# Altium footprint library Package_DFN_QFN.PcbLib: 557 footprints (part 7 of 35)
Each footprint in its own frame and in the unit in brackets; x right, y up, seen from the top. Pads: shape width x height; smd on the part's side, far side on the other; paste and mask are expansions set on the pad; w line width, h text height; cw(c..) or ccw(c..) is an arc to the next point about the centre after c.
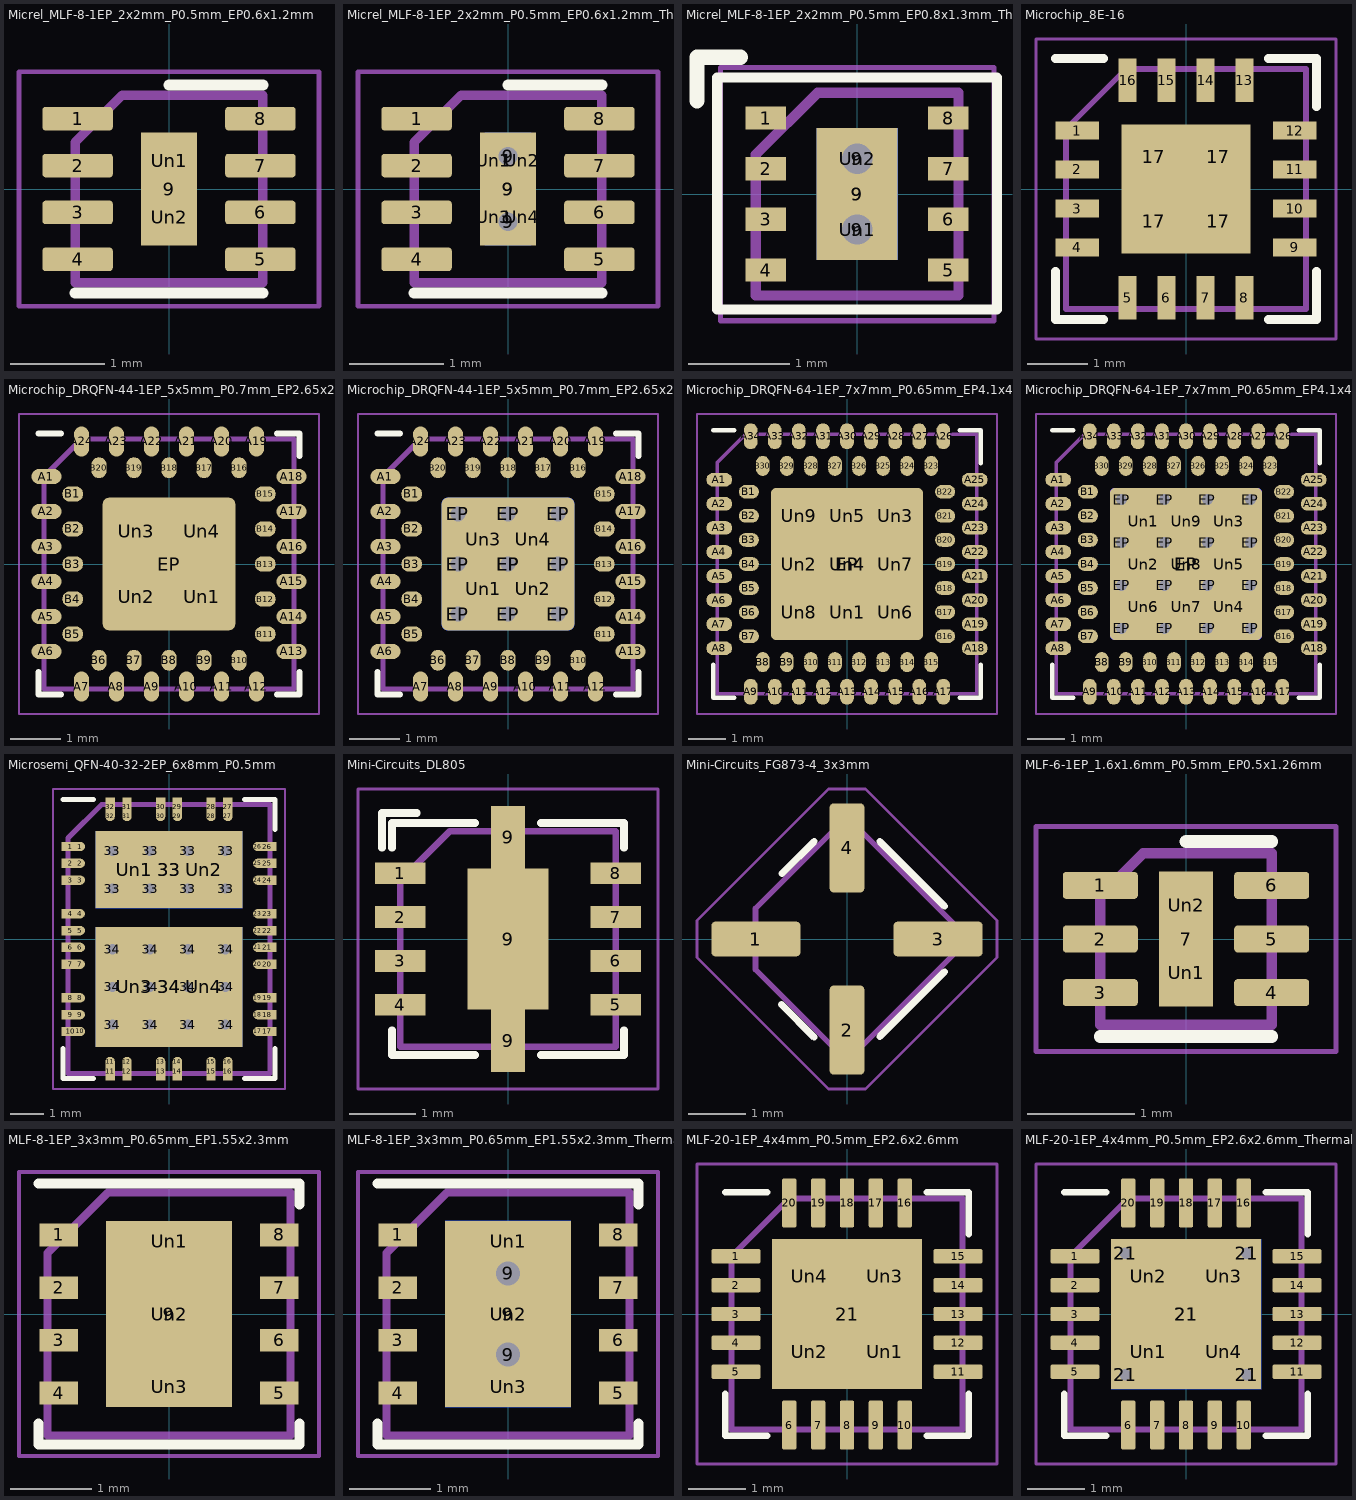
[diagram p6: the footprints below, top view; thin cyan lines are the x and y axes]

## Micrel_MLF-8-1EP_2x2mm_P0.5mm_EP0.6x1.2mm [mm]
pads (11):
  rrect25% 0.75x0.25 smd: 1(-0.975,0.75) 2(-0.975,0.25) 3(-0.975,-0.25) 4(-0.975,-0.75) 5(0.975,-0.75) 6(0.975,-0.25) 7(0.975,0.25) 8(0.975,0.75)
  rect 0.6x1.2 smd: 9(0,0)
  rrect25% 0.48x0.48 on Top Paste: Un1(0,0.3) Un2(0,-0.3)
F.SilkS:
  lines w0.12: -1,-1.11 1,-1.11 ; 0,1.11 1,1.11
F.CrtYd:
  lines w0.05: -1.6,-1.25 1.6,-1.25 1.6,1.25 -1.6,1.25 -1.6,-1.25
F.Fab:
  lines w0.1: -1,-1 -1,0.5 -0.5,1 1,1 1,-1 -1,-1
  text "'.Designator'" at -2.028,-0.425 h0.5

## Micrel_MLF-8-1EP_2x2mm_P0.5mm_EP0.6x1.2mm_ThermalVias [mm]
pads (16):
  rrect25% 0.75x0.25 smd: 1(-0.975,0.75) 2(-0.975,0.25) 3(-0.975,-0.25) 4(-0.975,-0.75) 5(0.975,-0.75) 6(0.975,-0.25) 7(0.975,0.25) 8(0.975,0.75)
  round 0.5 hole 0.2: 9(0,-0.35) 9(0,0.35)
  rect 0.5x1.2 smd far side: 9(0,0)
  rect 0.6x1.2 smd: 9(0,0)
  rrect25% 0.24x0.48 on Top Paste: Un1(-0.15,0.3) Un2(0.15,0.3) Un3(-0.15,-0.3) Un4(0.15,-0.3)
F.SilkS:
  lines w0.12: -1,-1.11 1,-1.11 ; 0,1.11 1,1.11
F.CrtYd:
  lines w0.05: -1.6,-1.25 -1.6,1.25 1.6,1.25 1.6,-1.25 -1.6,-1.25
F.Fab:
  lines w0.1: -1,-1 1,-1 1,1 -0.5,1 -1,0.5 -1,-1
  text "'.Designator'" at -2.028,-0.425 h0.5

## Micrel_MLF-8-1EP_2x2mm_P0.5mm_EP0.8x1.3mm_ThermalVias [mm]
pads (14):
  rect 0.4x0.23 smd: 1(-0.9,0.75) 2(-0.9,0.25) 3(-0.9,-0.25) 4(-0.9,-0.75) 5(0.9,-0.75) 6(0.9,-0.25) 7(0.9,0.25) 8(0.9,0.75)
  round 0.6 hole 0.3: 9(0,-0.35) 9(0,0.35)
  rect 0.8x1.3 smd far side: 9(0,0)
  rect 0.8x1.3 smd: 9(0,0)
  rect 0.55x0.55 on Top Paste: Un1(0,-0.35) Un2(0,0.35)
F.SilkS:
  lines w0.1: -1.38,-1.14 -1.38,1.15 1.38,1.15 1.38,-1.14 -1.38,-1.14
  lines w0.15: -1.58,0.92 -1.58,1.35 -1.15,1.35
F.CrtYd:
  lines w0.05: -1.35,-1.25 1.35,-1.25 1.35,1.25 -1.35,1.25 -1.35,-1.25
F.Fab:
  lines w0.1: -1,0.38 -1,-1 1,-1 1,1 -0.39,1 -1,0.39
  text "'.Designator'" at -2.023,-0.42 h0.5

## Microchip_8E-16 [mm]
pads (20):
  rect 0.725x0.3 smd: 1(-1.813,0.975) 2(-1.813,0.325) 3(-1.813,-0.325) 4(-1.813,-0.975) 9(1.813,-0.975) 10(1.813,-0.325) 11(1.813,0.325) 12(1.813,0.975)
  rect 0.3x0.725 smd: 5(-0.975,-1.813) 6(-0.325,-1.813) 7(0.325,-1.813) 8(0.975,-1.813) 13(0.975,1.813) 14(0.325,1.813) 15(-0.325,1.813) 16(-0.975,1.813)
  rect 1.075x1.075 smd: 17(-0.537,-0.537) 17(-0.537,0.537) 17(0.537,-0.537) 17(0.537,0.537)
F.SilkS:
  lines w0.15: -2.175,-1.375 -2.175,-2.175 -1.375,-2.175 ; -2.175,2.175 -1.375,2.175 ; 1.375,-2.175 2.175,-2.175 2.175,-1.375 ; 1.375,2.175 2.175,2.175 2.175,1.375
F.CrtYd:
  lines w0.05: -2.5,-2.5 -2.5,2.5 2.5,2.5 2.5,-2.5 -2.5,-2.5
F.Fab:
  lines w0.1: -2,-2 2,-2 2,2 -1,2 -2,1 -2,-2
  text "'.Designator'" at -3.267,-0.702 h0.8

## Microchip_DRQFN-44-1EP_5x5mm_P0.7mm_EP2.65x2.65mm [mm]
pads (49):
  rrect100% 0.6x0.3 smd: A1(-2.45,1.75) A2(-2.45,1.05) A3(-2.45,0.35) A4(-2.45,-0.35) A5(-2.45,-1.05) A6(-2.45,-1.75) A13(2.45,-1.75) A14(2.45,-1.05) A15(2.45,-0.35) A16(2.45,0.35) A17(2.45,1.05) A18(2.45,1.75)
  rrect100% 0.3x0.6 smd: A7(-1.75,-2.45) A8(-1.05,-2.45) A9(-0.35,-2.45) A10(0.35,-2.45) A11(1.05,-2.45) A12(1.75,-2.45) A19(1.75,2.45) A20(1.05,2.45) A21(0.35,2.45) A22(-0.35,2.45) A23(-1.05,2.45) A24(-1.75,2.45)
  rrect100% 0.42x0.3 smd: B1(-1.925,1.4) B2(-1.925,0.7) B3(-1.925,0) B4(-1.925,-0.7) B5(-1.925,-1.4) B11(1.925,-1.4) B12(1.925,-0.7) B13(1.925,0) B14(1.925,0.7) B15(1.925,1.4)
  rrect100% 0.3x0.42 smd: B6(-1.4,-1.925) B7(-0.7,-1.925) B8(0,-1.925) B9(0.7,-1.925) B10(1.4,-1.925) B16(1.4,1.925) B17(0.7,1.925) B18(0,1.925) B19(-0.7,1.925) B20(-1.4,1.925)
  rrect9% 2.65x2.65 smd: EP(0,0)
  rrect10% 1.1x1.1 on Top Paste: Un1(0.65,-0.65) Un2(-0.65,-0.65) Un3(-0.65,0.65) Un4(0.65,0.65)
F.SilkS:
  lines w0.12: -2.61,-2.16 -2.61,-2.61 -2.16,-2.61 ; -2.61,2.61 -2.16,2.61 ; 2.16,-2.61 2.61,-2.61 2.61,-2.16 ; 2.16,2.61 2.61,2.61 2.61,2.16
F.CrtYd:
  lines w0.05: -3,-3 -3,3 3,3 3,-3 -3,-3
F.Fab:
  lines w0.1: -2.5,-2.5 -2.5,1.75 -1.75,2.5 2.5,2.5 2.5,-2.5 -2.5,-2.5
  text "'.Designator'" at -4.047,-0.84 h1

## Microchip_DRQFN-44-1EP_5x5mm_P0.7mm_EP2.65x2.65mm_ThermalVias [mm]
pads (59):
  rrect100% 0.6x0.3 smd: A1(-2.45,1.75) A2(-2.45,1.05) A3(-2.45,0.35) A4(-2.45,-0.35) A5(-2.45,-1.05) A6(-2.45,-1.75) A13(2.45,-1.75) A14(2.45,-1.05) A15(2.45,-0.35) A16(2.45,0.35) A17(2.45,1.05) A18(2.45,1.75)
  rrect100% 0.3x0.6 smd: A7(-1.75,-2.45) A8(-1.05,-2.45) A9(-0.35,-2.45) A10(0.35,-2.45) A11(1.05,-2.45) A12(1.75,-2.45) A19(1.75,2.45) A20(1.05,2.45) A21(0.35,2.45) A22(-0.35,2.45) A23(-1.05,2.45) A24(-1.75,2.45)
  rrect100% 0.42x0.3 smd: B1(-1.925,1.4) B2(-1.925,0.7) B3(-1.925,0) B4(-1.925,-0.7) B5(-1.925,-1.4) B11(1.925,-1.4) B12(1.925,-0.7) B13(1.925,0) B14(1.925,0.7) B15(1.925,1.4)
  rrect100% 0.3x0.42 smd: B6(-1.4,-1.925) B7(-0.7,-1.925) B8(0,-1.925) B9(0.7,-1.925) B10(1.4,-1.925) B16(1.4,1.925) B17(0.7,1.925) B18(0,1.925) B19(-0.7,1.925) B20(-1.4,1.925)
  round 0.6 hole 0.3: EP(-1,-1) EP(-1,0) EP(-1,1) EP(0,-1) EP(0,0) EP(0,1) EP(1,-1) EP(1,0) EP(1,1)
  rrect9% 2.65x2.65 smd far side: EP(0,0)
  rrect9% 2.65x2.65 smd: EP(0,0)
  rrect25% 0.85x0.85 on Top Paste: Un1(-0.5,-0.5) Un2(0.5,-0.5) Un3(-0.5,0.5) Un4(0.5,0.5)
F.SilkS:
  lines w0.12: -2.61,-2.16 -2.61,-2.61 -2.16,-2.61 ; -2.61,2.61 -2.16,2.61 ; 2.16,-2.61 2.61,-2.61 2.61,-2.16 ; 2.16,2.61 2.61,2.61 2.61,2.16
F.CrtYd:
  lines w0.05: -3,-3 -3,3 3,3 3,-3 -3,-3
F.Fab:
  lines w0.1: -2.5,-2.5 2.5,-2.5 2.5,2.5 -1.75,2.5 -2.5,1.75 -2.5,-2.5
  text "'.Designator'" at -4.047,-0.84 h1

## Microchip_DRQFN-64-1EP_7x7mm_P0.65mm_EP4.1x4.1mm [mm]
pads (74):
  rrect100% 0.7x0.37 smd: A1(-3.45,2.275) A2(-3.45,1.625) A3(-3.45,0.975) A4(-3.45,0.325) A5(-3.45,-0.325) A6(-3.45,-0.975) A7(-3.45,-1.625) A8(-3.45,-2.275) A18(3.45,-2.275) A19(3.45,-1.625) A20(3.45,-0.975) A21(3.45,-0.325) A22(3.45,0.325) A23(3.45,0.975) A24(3.45,1.625) A25(3.45,2.275)
  rrect100% 0.37x0.7 smd: A9(-2.6,-3.45) A10(-1.95,-3.45) A11(-1.3,-3.45) A12(-0.65,-3.45) A13(0,-3.45) A14(0.65,-3.45) A15(1.3,-3.45) A16(1.95,-3.45) A17(2.6,-3.45) A26(2.6,3.45) A27(1.95,3.45) A28(1.3,3.45) A29(0.65,3.45) A30(0,3.45) A31(-0.65,3.45) A32(-1.3,3.45) A33(-1.95,3.45) A34(-2.6,3.45)
  rrect100% 0.54x0.37 smd: B1(-2.65,1.95) B2(-2.65,1.3) B3(-2.65,0.65) B4(-2.65,0) B5(-2.65,-0.65) B6(-2.65,-1.3) B7(-2.65,-1.95) B16(2.65,-1.95) B17(2.65,-1.3) B18(2.65,-0.65) B19(2.65,0) B20(2.65,0.65) B21(2.65,1.3) B22(2.65,1.95)
  rrect100% 0.37x0.54 smd: B8(-2.275,-2.65) B9(-1.625,-2.65) B10(-0.975,-2.65) B11(-0.325,-2.65) B12(0.325,-2.65) B13(0.975,-2.65) B14(1.625,-2.65) B15(2.275,-2.65) B23(2.275,2.65) B24(1.625,2.65) B25(0.975,2.65) B26(0.325,2.65) B27(-0.325,2.65) B28(-0.975,2.65) B29(-1.625,2.65) B30(-2.275,2.65)
  rrect6% 4.1x4.1 smd: EP(0,0)
  rrect10% 1.15x1.15 on Top Paste: Un1(0,-1.3) Un2(-1.3,0) Un3(1.3,1.3) Un4(0,0) Un5(0,1.3) Un6(1.3,-1.3) Un7(1.3,0) Un8(-1.3,-1.3) Un9(-1.3,1.3)
F.SilkS:
  lines w0.12: -3.61,-2.72 -3.61,-3.61 -3.045,-3.61 ; -3.61,3.61 -3.045,3.61 ; 3.045,-3.61 3.61,-3.61 3.61,-2.72 ; 3.045,3.61 3.61,3.61 3.61,2.72
F.CrtYd:
  lines w0.05: -4.05,-4.05 4.05,-4.05 4.05,4.05 -4.05,4.05 -4.05,-4.05
F.Fab:
  lines w0.1: -3.5,-3.5 3.5,-3.5 3.5,3.5 -2.75,3.5 -3.5,2.75 -3.5,-3.5
  text "'.Designator'" at -4.047,-0.84 h1

## Microchip_DRQFN-64-1EP_7x7mm_P0.65mm_EP4.1x4.1mm_ThermalVias [mm]
pads (91):
  rrect100% 0.7x0.37 smd: A1(-3.45,2.275) A2(-3.45,1.625) A3(-3.45,0.975) A4(-3.45,0.325) A5(-3.45,-0.325) A6(-3.45,-0.975) A7(-3.45,-1.625) A8(-3.45,-2.275) A18(3.45,-2.275) A19(3.45,-1.625) A20(3.45,-0.975) A21(3.45,-0.325) A22(3.45,0.325) A23(3.45,0.975) A24(3.45,1.625) A25(3.45,2.275)
  rrect100% 0.37x0.7 smd: A9(-2.6,-3.45) A10(-1.95,-3.45) A11(-1.3,-3.45) A12(-0.65,-3.45) A13(0,-3.45) A14(0.65,-3.45) A15(1.3,-3.45) A16(1.95,-3.45) A17(2.6,-3.45) A26(2.6,3.45) A27(1.95,3.45) A28(1.3,3.45) A29(0.65,3.45) A30(0,3.45) A31(-0.65,3.45) A32(-1.3,3.45) A33(-1.95,3.45) A34(-2.6,3.45)
  rrect100% 0.54x0.37 smd: B1(-2.65,1.95) B2(-2.65,1.3) B3(-2.65,0.65) B4(-2.65,0) B5(-2.65,-0.65) B6(-2.65,-1.3) B7(-2.65,-1.95) B16(2.65,-1.95) B17(2.65,-1.3) B18(2.65,-0.65) B19(2.65,0) B20(2.65,0.65) B21(2.65,1.3) B22(2.65,1.95)
  rrect100% 0.37x0.54 smd: B8(-2.275,-2.65) B9(-1.625,-2.65) B10(-0.975,-2.65) B11(-0.325,-2.65) B12(0.325,-2.65) B13(0.975,-2.65) B14(1.625,-2.65) B15(2.275,-2.65) B23(2.275,2.65) B24(1.625,2.65) B25(0.975,2.65) B26(0.325,2.65) B27(-0.325,2.65) B28(-0.975,2.65) B29(-1.625,2.65) B30(-2.275,2.65)
  round 0.6 hole 0.3: EP(-1.74,-1.74) EP(-1.74,-0.58) EP(-1.74,0.58) EP(-1.74,1.74) EP(-0.58,-1.74) EP(-0.58,-0.58) EP(-0.58,0.58) EP(-0.58,1.74) EP(0.58,-1.74) EP(0.58,-0.58) EP(0.58,0.58) EP(0.58,1.74) EP(1.74,-1.74) EP(1.74,-0.58) EP(1.74,0.58) EP(1.74,1.74)
  rrect6% 4.1x4.1 smd: EP(0,0)
  rrect6% 4.1x4.1 smd far side: EP(0,0)
  rrect25% 1x1 on Top Paste: Un1(-1.16,1.16) Un2(-1.16,0) Un3(1.16,1.16) Un4(1.16,-1.16) Un5(1.16,0) Un6(-1.16,-1.16) Un7(0,-1.16) Un8(0,0) Un9(0,1.16)
F.SilkS:
  lines w0.12: -3.61,-2.72 -3.61,-3.61 -3.045,-3.61 ; -3.61,3.61 -3.045,3.61 ; 3.045,-3.61 3.61,-3.61 3.61,-2.72 ; 3.045,3.61 3.61,3.61 3.61,2.72
F.CrtYd:
  lines w0.05: -4.05,-4.05 -4.05,4.05 4.05,4.05 4.05,-4.05 -4.05,-4.05
F.Fab:
  lines w0.1: -3.5,-3.5 3.5,-3.5 3.5,3.5 -2.75,3.5 -3.5,2.75 -3.5,-3.5
  text "'.Designator'" at -4.047,-0.84 h1

## Microsemi_QFN-40-32-2EP_6x8mm_P0.5mm [mm]
pads (92):
  rect 0.56x0.28 smd: 1(-2.92,2.75) 2(-2.92,2.25) 3(-2.92,1.75) 4(-2.92,0.75) 5(-2.92,0.25) 6(-2.92,-0.25) 7(-2.92,-0.75) 8(-2.92,-1.75) 9(-2.92,-2.25) 10(-2.92,-2.75) 17(2.92,-2.75) 18(2.92,-2.25) 19(2.92,-1.75) 20(2.92,-0.75) 21(2.92,-0.25) 22(2.92,0.25) 23(2.92,0.75) 24(2.92,1.75) 25(2.92,2.25) 26(2.92,2.75)
  round 0.28 smd: 1(-2.64,2.75) 2(-2.64,2.25) 3(-2.64,1.75) 4(-2.64,0.75) 5(-2.64,0.25) 6(-2.64,-0.25) 7(-2.64,-0.75) 8(-2.64,-1.75) 9(-2.64,-2.25) 10(-2.64,-2.75) 11(-1.75,-3.645) 12(-1.25,-3.645) 13(-0.25,-3.645) 14(0.25,-3.645) 15(1.25,-3.645) 16(1.75,-3.645) 17(2.64,-2.75) 18(2.64,-2.25) 19(2.64,-1.75) 20(2.64,-0.75) 21(2.64,-0.25) 22(2.64,0.25) 23(2.64,0.75) 24(2.64,1.75) 25(2.64,2.25) 26(2.64,2.75) 27(1.75,3.645) 28(1.25,3.645) 29(0.25,3.645) 30(-0.25,3.645) 31(-1.25,3.645) 32(-1.75,3.645)
  rect 0.28x0.56 smd: 11(-1.75,-3.925) 12(-1.25,-3.925) 13(-0.25,-3.925) 14(0.25,-3.925) 15(1.25,-3.925) 16(1.75,-3.925) 27(1.75,3.925) 28(1.25,3.925) 29(0.25,3.925) 30(-0.25,3.925) 31(-1.25,3.925) 32(-1.75,3.925)
  round 0.6 hole 0.3: 33(-1.68,1.5) 33(-1.68,2.62) 33(-0.56,1.5) 33(-0.56,2.62) 33(0.56,1.5) 33(0.56,2.62) 33(1.68,1.5) 33(1.68,2.62) 34(-1.68,-2.545) 34(-1.68,-1.425) 34(-1.68,-0.305) 34(-0.56,-2.545) 34(-0.56,-1.425) 34(-0.56,-0.305) 34(0.56,-2.545) 34(0.56,-1.425) 34(0.56,-0.305) 34(1.68,-2.545) 34(1.68,-1.425) 34(1.68,-0.305)
  rect 4.37x2.29 smd far side: 33(0,2.06)
  rect 4.37x2.29 smd: 33(0,2.06)
  rect 4.37x3.56 smd: 34(0,-1.425)
  rect 4.37x3.56 smd far side: 34(0,-1.425)
  rect 1.68x1.68 on Top Paste: Un1(-1.04,2.06) Un2(1.04,2.06)
  rect 1.68x2.95 on Top Paste: Un3(-1.04,-1.425) Un4(1.04,-1.425)
F.SilkS:
  lines w0.15: -3.15,-3.25 -3.15,-4.15 -2.25,-4.15 ; -3.15,4.15 -2.25,4.15 ; 2.25,-4.15 3.15,-4.15 3.15,-3.25 ; 2.25,4.15 3.15,4.15 3.15,3.25
F.CrtYd:
  lines w0.05: -3.45,-4.46 3.45,-4.46 3.45,4.46 -3.45,4.46 -3.45,-4.46
F.Fab:
  lines w0.15: -3,-4 -3,3 -2,4 3,4 3,-4 -3,-4
  text "'.Designator'" at -4.047,-0.84 h1

## Mini-Circuits_DL805 [mm]
pads (11):
  rect 0.76x0.33 smd: 1(-1.625,0.99) 2(-1.625,0.33) 3(-1.625,-0.33) 4(-1.625,-0.99) 5(1.625,-0.99) 6(1.625,-0.33) 7(1.625,0.33) 8(1.625,0.99)
  rect 0.51x0.94 smd: 9(0,-1.535) 9(0,1.535)
  rect 1.22x2.13 smd: 9(0,0)
F.SilkS:
  lines w0.12: -1.9,1.375 -1.9,1.9 -1.375,1.9 ; -1.75,-1.375 -1.75,-1.75 -0.5,-1.75 ; -1.75,1.375 -1.75,1.75 -0.5,1.75 ; 0.5,-1.75 1.75,-1.75 1.75,-1.375 ; 0.5,1.75 1.75,1.75 1.75,1.375
F.CrtYd:
  lines w0.05: -2.26,-2.26 -2.26,2.26 2.26,2.26 2.26,-2.26 -2.26,-2.26
F.Fab:
  lines w0.1: -1.625,-1.625 1.625,-1.625 1.625,1.625 -0.875,1.625 -1.625,0.875 -1.625,-1.625
  text "'.Designator'" at -0.42,2.023 h0.5

## Mini-Circuits_FG873-4_3x3mm [mm]
pads (4):
  rrect25% 1.55x0.61 smd: 1(-1.585,0) 3(1.585,0)
  rrect25% 0.61x1.55 smd: 2(0,-1.585) 4(0,1.585)
F.SilkS:
  lines w0.12: -1.14,-1.14 -0.57,-1.71 ; -1.13,1.14 -0.57,1.7 ; 0.57,-1.7 1.7,-0.57 ; 0.57,1.7 1.7,0.57
F.CrtYd:
  lines w0.05: -2.61,-0.32 -2.61,0.32 -0.32,2.61 0.32,2.61 2.61,0.32 2.61,-0.32 0.32,-2.61 -0.32,-2.61 -2.61,-0.32
F.Fab:
  lines w0.1: -1.591,-0.53 -1.591,0.53 0,2.121 2.121,0 0,-2.121 -1.591,-0.53
  text "'.Designator'" at -2.838,-0.593 h0.7

## MLF-6-1EP_1.6x1.6mm_P0.5mm_EP0.5x1.26mm [mm]
pads (9):
  rrect25% 0.7x0.25 smd: 1(-0.8,0.5) 2(-0.8,0) 3(-0.8,-0.5) 4(0.8,-0.5) 5(0.8,0) 6(0.8,0.5)
  rect 0.5x1.26 smd: 7(0,0)
  rrect25% 0.4x0.51 on Top Paste: Un1(0,-0.315) Un2(0,0.315)
F.SilkS:
  lines w0.12: -0.8,-0.91 0.8,-0.91 ; 0,0.91 0.8,0.91
F.CrtYd:
  lines w0.05: -1.4,-1.05 1.4,-1.05 1.4,1.05 -1.4,1.05 -1.4,-1.05
F.Fab:
  lines w0.1: -0.8,-0.8 -0.8,0.4 -0.4,0.8 0.8,0.8 0.8,-0.8 -0.8,-0.8
  text "'.Designator'" at -1.619,-0.336 h0.4

## MLF-8-1EP_3x3mm_P0.65mm_EP1.55x2.3mm [mm]
pads (12):
  rect 0.48x0.28 smd: 1(-1.36,0.975) 2(-1.36,0.325) 3(-1.36,-0.325) 4(-1.36,-0.975) 5(1.36,-0.975) 6(1.36,-0.325) 7(1.36,0.325) 8(1.36,0.975)
  rect 1.55x2.3 smd: 9(0,0)
  rect 1.5x0.4 on Top Paste: Un1(0,0.9) Un3(0,-0.9)
  rect 1.5x0.65 on Top Paste: Un2(0,0)
F.SilkS:
  lines w0.12: -1.61,-1.35 -1.61,-1.61 1.61,-1.61 1.61,-1.35 ; -1.61,1.61 1.61,1.61 1.61,1.35
F.CrtYd:
  lines w0.05: -1.85,-1.75 1.85,-1.75 1.85,1.75 -1.85,1.75 -1.85,-1.75
F.Fab:
  lines w0.1: -1.5,-1.5 -1.5,0.75 -0.75,1.5 1.5,1.5 1.5,-1.5 -1.5,-1.5
  text "'.Designator'" at -2.833,-0.588 h0.7

## MLF-8-1EP_3x3mm_P0.65mm_EP1.55x2.3mm_ThermalVias [mm]
pads (15):
  rect 0.48x0.28 smd: 1(-1.36,0.975) 2(-1.36,0.325) 3(-1.36,-0.325) 4(-1.36,-0.975) 5(1.36,-0.975) 6(1.36,-0.325) 7(1.36,0.325) 8(1.36,0.975)
  round 0.6 hole 0.3: 9(0,-0.5) 9(0,0.5)
  rect 1.55x2.3 smd: 9(0,0)
  rect 1.55x2.3 smd far side: 9(0,0)
  rect 1.5x0.4 on Top Paste: Un1(0,0.9) Un3(0,-0.9)
  rect 1.5x0.65 on Top Paste: Un2(0,0)
F.SilkS:
  lines w0.12: -1.61,-1.35 -1.61,-1.61 1.61,-1.61 1.61,-1.35 ; -1.61,1.61 1.61,1.61 1.61,1.35
F.CrtYd:
  lines w0.05: -1.85,-1.75 1.85,-1.75 1.85,1.75 -1.85,1.75 -1.85,-1.75
F.Fab:
  lines w0.1: -1.5,-1.5 -1.5,0.75 -0.75,1.5 1.5,1.5 1.5,-1.5 -1.5,-1.5
  text "'.Designator'" at -2.833,-0.588 h0.7

## MLF-20-1EP_4x4mm_P0.5mm_EP2.6x2.6mm [mm]
pads (25):
  rrect25% 0.85x0.25 smd: 1(-1.925,1) 2(-1.925,0.5) 3(-1.925,0) 4(-1.925,-0.5) 5(-1.925,-1) 11(1.925,-1) 12(1.925,-0.5) 13(1.925,0) 14(1.925,0.5) 15(1.925,1)
  rrect25% 0.25x0.85 smd: 6(-1,-1.925) 7(-0.5,-1.925) 8(0,-1.925) 9(0.5,-1.925) 10(1,-1.925) 16(1,1.925) 17(0.5,1.925) 18(0,1.925) 19(-0.5,1.925) 20(-1,1.925)
  rect 2.6x2.6 smd: 21(0,0)
  rrect24% 1.05x1.05 on Top Paste: Un1(0.65,-0.65) Un2(-0.65,-0.65) Un3(0.65,0.65) Un4(-0.65,0.65)
F.SilkS:
  lines w0.12: -2.11,-1.385 -2.11,-2.11 -1.385,-2.11 ; -2.11,2.11 -1.385,2.11 ; 1.385,-2.11 2.11,-2.11 2.11,-1.385 ; 1.385,2.11 2.11,2.11 2.11,1.385
F.CrtYd:
  lines w0.05: -2.6,-2.6 -2.6,2.6 2.6,2.6 2.6,-2.6 -2.6,-2.6
F.Fab:
  lines w0.1: -2,-2 2,-2 2,2 -1,2 -2,1 -2,-2
  text "'.Designator'" at -4.047,-0.84 h1

## MLF-20-1EP_4x4mm_P0.5mm_EP2.6x2.6mm_ThermalVias [mm]
pads (30):
  rrect25% 0.85x0.25 smd: 1(-1.925,1) 2(-1.925,0.5) 3(-1.925,0) 4(-1.925,-0.5) 5(-1.925,-1) 11(1.925,-1) 12(1.925,-0.5) 13(1.925,0) 14(1.925,0.5) 15(1.925,1)
  rrect25% 0.25x0.85 smd: 6(-1,-1.925) 7(-0.5,-1.925) 8(0,-1.925) 9(0.5,-1.925) 10(1,-1.925) 16(1,1.925) 17(0.5,1.925) 18(0,1.925) 19(-0.5,1.925) 20(-1,1.925)
  round 0.5 hole 0.2: 21(-1.05,-1.05) 21(-1.05,1.05) 21(1.05,-1.05) 21(1.05,1.05)
  rect 2.6x2.6 smd: 21(0,0)
  rect 2.6x2.6 smd far side: 21(0,0)
  rrect22% 1.13x1.13 on Top Paste: Un1(-0.65,-0.65) Un2(-0.65,0.65) Un3(0.65,0.65) Un4(0.65,-0.65)
F.SilkS:
  lines w0.12: -2.11,-1.385 -2.11,-2.11 -1.385,-2.11 ; -2.11,2.11 -1.385,2.11 ; 1.385,-2.11 2.11,-2.11 2.11,-1.385 ; 1.385,2.11 2.11,2.11 2.11,1.385
F.CrtYd:
  lines w0.05: -2.6,-2.6 -2.6,2.6 2.6,2.6 2.6,-2.6 -2.6,-2.6
F.Fab:
  lines w0.1: -2,-2 2,-2 2,2 -1,2 -2,1 -2,-2
  text "'.Designator'" at -4.047,-0.84 h1